# Altium footprint library North POLE.PcbLib: 419 footprints (part 17 of 27)
Each footprint in its own frame and in the unit in brackets; x right, y up, seen from the top. Pads: shape width x height; smd on the part's side, far side on the other; paste and mask are expansions set on the pad; w line width, h text height; cw(c..) or ccw(c..) is an arc to the next point about the centre after c.
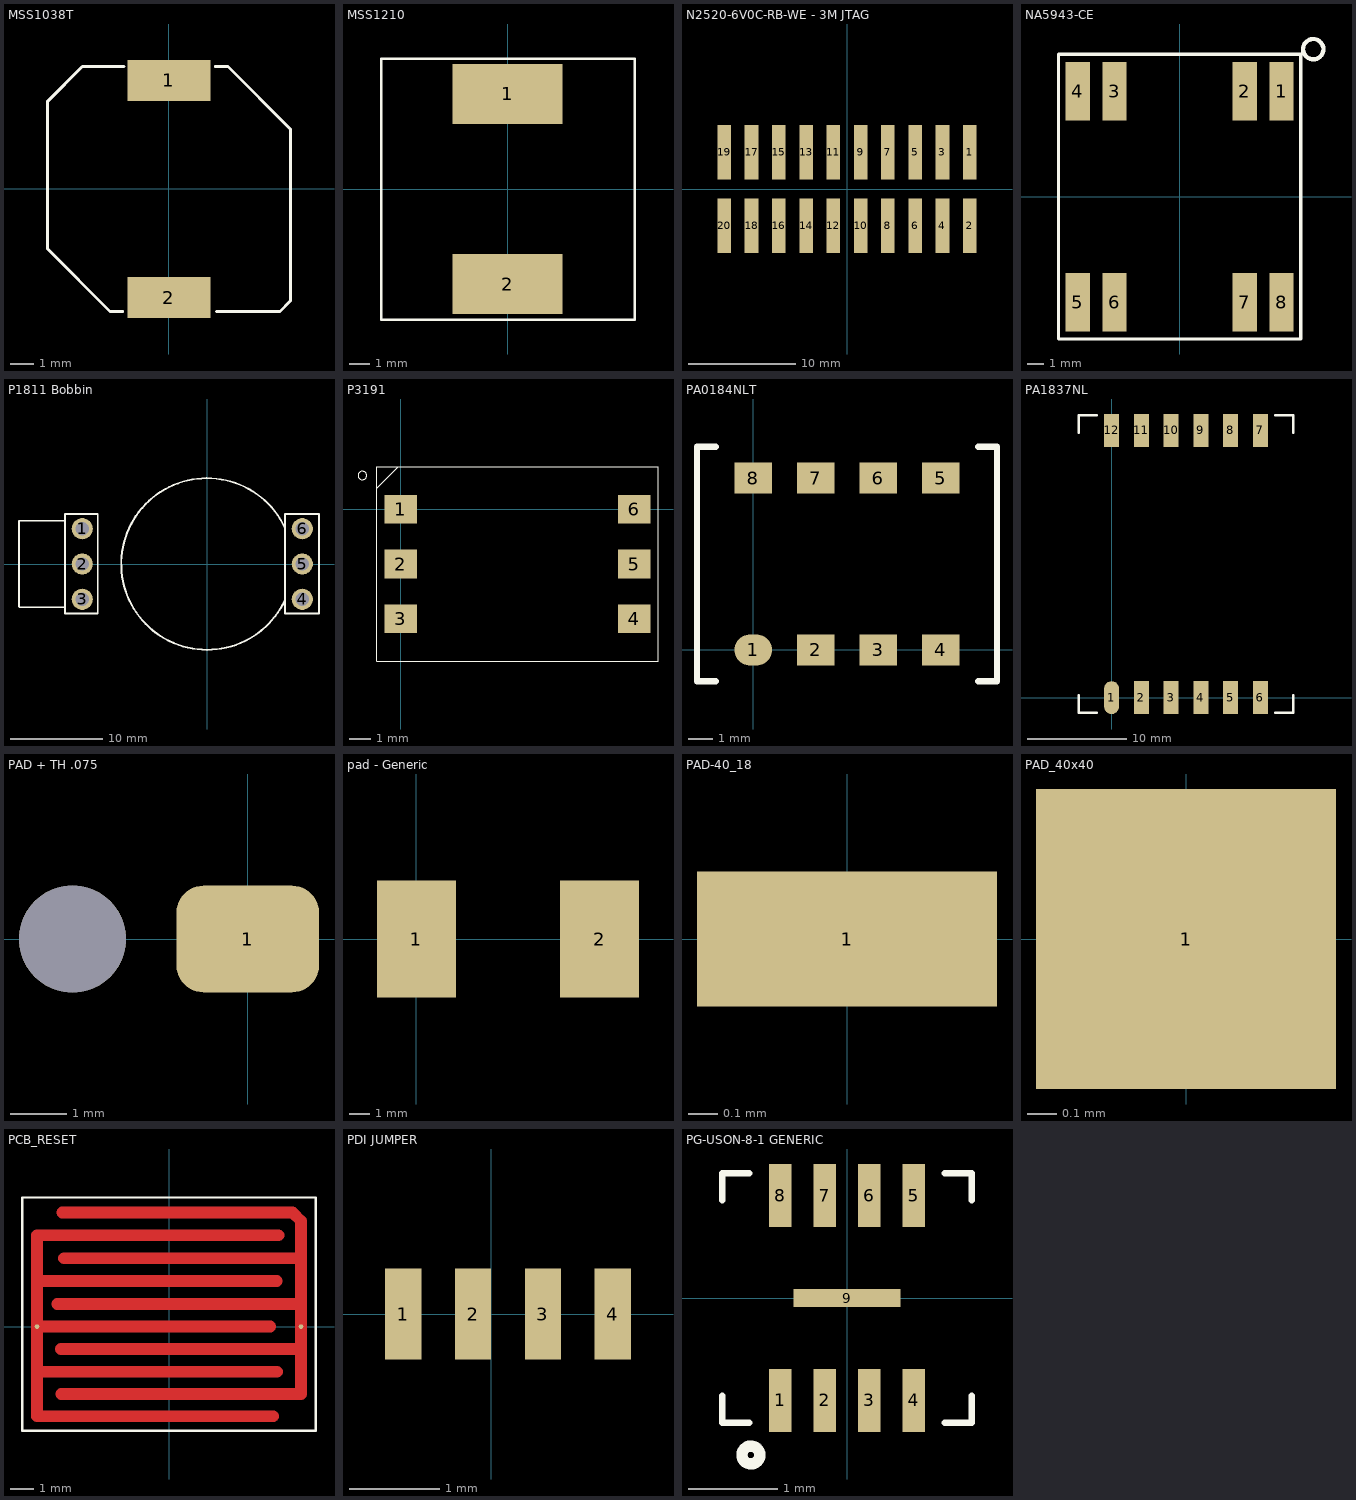
[diagram p16: the footprints below, top view; thin cyan lines are the x and y axes]

## MSS1038T [mm]
pads (2):
  rect 3.58x1.78 smd mask+0.08: 1(0,4.7) 2(0,-4.7)
Top Overlay:
  lines w0.127: -2,-5.3 -2.55,-5.3 -5.25,-2.6 -5.25,3.8 -3.75,5.3 -1.95,5.3 ; 2,5.3 2.55,5.3 5.25,2.6 5.25,-4.85 4.8,-5.3 2.05,-5.3
3D body: height 4, standoff 0, extent -5.1,-5.15 5.1,5.15

## MSS1210 [mm]
pads (2):
  rect 5.5x3 smd mask+0.08: 1(0,4.75) 2(0,-4.75)
Top Overlay:
  lines w0.127: -6.332,-6.528 6.365,-6.528 6.365,6.518 -6.332,6.518 -6.332,-6.528
3D body: height 10.16, standoff -0.04, extent -6.15,-6.15 6.15,6.15

## N2520-6V0C-RB-WE - 3M JTAG [mm]
pads (20):
  rect 1.27x5.08 smd mask+0.08: 1(11.43,3.43) 2(11.43,-3.43) 3(8.89,3.43) 4(8.89,-3.43) 5(6.35,3.43) 6(6.35,-3.43) 7(3.81,3.43) 8(3.81,-3.43) 9(1.27,3.43) 10(1.27,-3.43) 11(-1.27,3.43) 12(-1.27,-3.43) 13(-3.81,3.43) 14(-3.81,-3.43) 15(-6.35,3.43) 16(-6.35,-3.43) 17(-8.89,3.43) 18(-8.89,-3.43) 19(-11.43,3.43) 20(-11.43,-3.43)
3D body: height 10.6, standoff -0.04, extent -16.546,-4.685 16.474,4.815

## NA5943-CE [mm] "PCB mounted battery connection"
pads (8):
  rect 1.45x3.5 smd: 1(6.11,6.32) 2(3.9,6.32) 3(-3.9,6.32) 4(-6.11,6.32) 5(-6.11,-6.32) 6(-3.9,-6.32) 7(3.9,-6.32) 8(6.11,-6.32)
Top Overlay:
  lines w0.203: -7.264,-8.534 7.264,-8.534 7.264,8.534 -7.264,8.534 -7.264,-8.534
  lines w0.254: 8.383,9.327 ccw(c8.008,8.846) 8.471,9.243
3D body: height 12.06, standoff 0, extent -5.385,-6.35 5.385,6.325

## nRF51822_WLCSP [mm]
height 0.5

## P1811 Bobbin [mil]
pads (6):
  round 90 hole 56 mask+3.15: 1(-531,150) 2(-531,0) 3(-531,-150) 4(405,-150) 5(405,0) 6(405,150)
Top Overlay:
  lines w8: -604,-184 -797,-184 -800,-181 -800,184 -604,184 ; 330.9,154.06 ccw(c0,0) 331.7,-152.32 ; -604,-211 -604,213 -465,212.99 -465,-211 -604,-211 ; 332,-210.97 476.02,-211 476.02,213.02 332,213.02 332,-210.97
3D body: height 210.39, standoff -88.61, extent -784.99,-362.2 462.01,362.21

## P3191 [mm]
pads (6):
  rect 1.5x1.32 smd: 1(0,0) 2(0,-2.54) 3(0,-5.08) 4(10.795,-5.08) 5(10.795,-2.54) 6(10.795,0)
Top Overlay:
  circle w0.051: c-1.778,1.549 r0.198
  lines w0.051: -1.118,0.965 -0.127,1.956 ; -1.118,-7.036 11.887,-7.036 11.887,1.956 -1.118,1.956 -1.118,-7.036

## PA0184NLT [mil] "Pulse xfrmr gate drive 1:1 SMD"
pads (8):
  oval 60x50 smd: 1(0,0)
  rect 60x50 smd: 2(100,0) 3(200,0) 4(300,0) 5(300,275) 6(200,275) 7(100,275) 8(0,275)
Top Overlay:
  lines w10: -60,-50 -90,-50 -90,325 -60,325 ; 360,-50 390,-50 390,325 360,325

## PA1837NL [mil] "Pulse flyback transformer"
height 450
pads (12):
  oval 60x130 smd: 1(0,0)
  rect 60x130 smd: 2(118,0) 3(236,0) 4(354,0) 5(472,0) 6(590,0) 7(590,1060) 8(472,1060) 9(354,1060) 10(236,1060) 11(118,1060) 12(0,1060)
Top Overlay:
  lines w10: -130,10 -130,-60 -60,-60 ; -130,1050 -130,1120 -60,1120 ; 650,-60 720,-60 720,10 ; 650,1120 720,1120 720,1050

## PAD + TH .075 [mil]
pads (2):
  rrect50% 100x75 smd mask+3.15: 1(0,0)
  round 75 hole 75 unplated mask+3.15: ""(-123,0)

## pad - Generic [mm]
pads (2):
  rect 3.94x5.84 smd: 1(0,0) 2(9.15,0)

## PAD-40_18 [mil] "0.040\" x 0.018\" pad"
pads (1):
  rect 40x18 smd: 1(0,0)

## PAD_40x40 [mil]
pads (1):
  rect 40x40 smd: 1(0,0)

## PCB_RESET [mm]
pads (2):
  round 0.2 smd mask+0.08: 1(-5.715,0) 2(5.715,0)
Top Layer:
  lines w0.508: -5.715,-3.88 -5.715,3.96 ; -5.67,1.98 4.66,1.98 ; -5.65,-3.88 4.51,-3.88 ; -5.64,0.01 4.38,0.01 ; -5.64,3.96 4.74,3.96 ; -5.61,-1.95 4.68,-1.95 ; -4.84,0.98 5.69,0.98 ; -4.68,-0.97 5.66,-0.97 ; -4.66,-2.92 5.62,-2.92 ; -4.62,4.94 5.35,4.94 5.715,4.575 5.715,-2.92 ; -4.55,2.96 5.42,2.96
Top Overlay:
  lines w0.102: -6.35,-4.5 6.35,-4.5 6.35,5.59 -6.35,5.59 -6.35,-4.5
Top Solder:
  region: -6.489,5.7 -6.489,-4.603 6.5,-4.603 6.5,5.7
  lines w0.508: -5.715,-3.88 -5.715,3.96 ; -5.67,1.98 4.66,1.98 ; -5.65,-3.88 4.51,-3.88 ; -5.64,0.01 4.38,0.01 ; -5.64,3.96 4.74,3.96 ; -5.61,-1.95 4.68,-1.95 ; -4.84,0.98 5.69,0.98 ; -4.68,-0.97 5.66,-0.97 ; -4.66,-2.92 5.62,-2.92 ; -4.62,4.94 5.35,4.94 5.715,4.575 5.715,-2.92 ; -4.55,2.96 5.42,2.96

## PDI JUMPER [mm]
pads (4):
  rect 0.4x1 smd mask+0.08: 1(-0.97,0.005) 2(-0.2,0.005) 3(0.57,0.005) 4(1.34,0.005)

## PG-USON-8-1 GENERIC [mm]
pads (9):
  rect 0.25x0.71 smd paste+0 mask+0.05: 1(-0.75,-1.15) 2(-0.25,-1.15) 3(0.25,-1.15) 4(0.75,-1.15) 5(0.75,1.15) 6(0.25,1.15) 7(-0.25,1.15) 8(-0.75,1.15)
  rect 1.2x0.2 smd mask+0.05: 9(0,0)
Top Overlay:
  lines w0.076: -1.4,-1.1 -1.4,-1.4 -1.1,-1.4 ; -1.4,1.1 -1.4,1.4 -1.1,1.4 ; 1.1,-1.4 1.4,-1.4 1.4,-1.1 ; 1.1,1.4 1.4,1.4 1.4,1.1
  lines w0.127: -1.007,-1.692 ccw(c-1.078,-1.763) -1,-1.7
3D body: height 0.6, standoff 0, extent -1.25,-1.25 1.26,1.26